# Altium footprint library pcb2D3D库101.PcbLib: 411 footprints (part 24 of 26)
Each footprint in its own frame and in the unit in brackets; x right, y up, seen from the top. Pads: shape width x height; smd on the part's side, far side on the other; paste and mask are expansions set on the pad; w line width, h text height; cw(c..) or ccw(c..) is an arc to the next point about the centre after c.
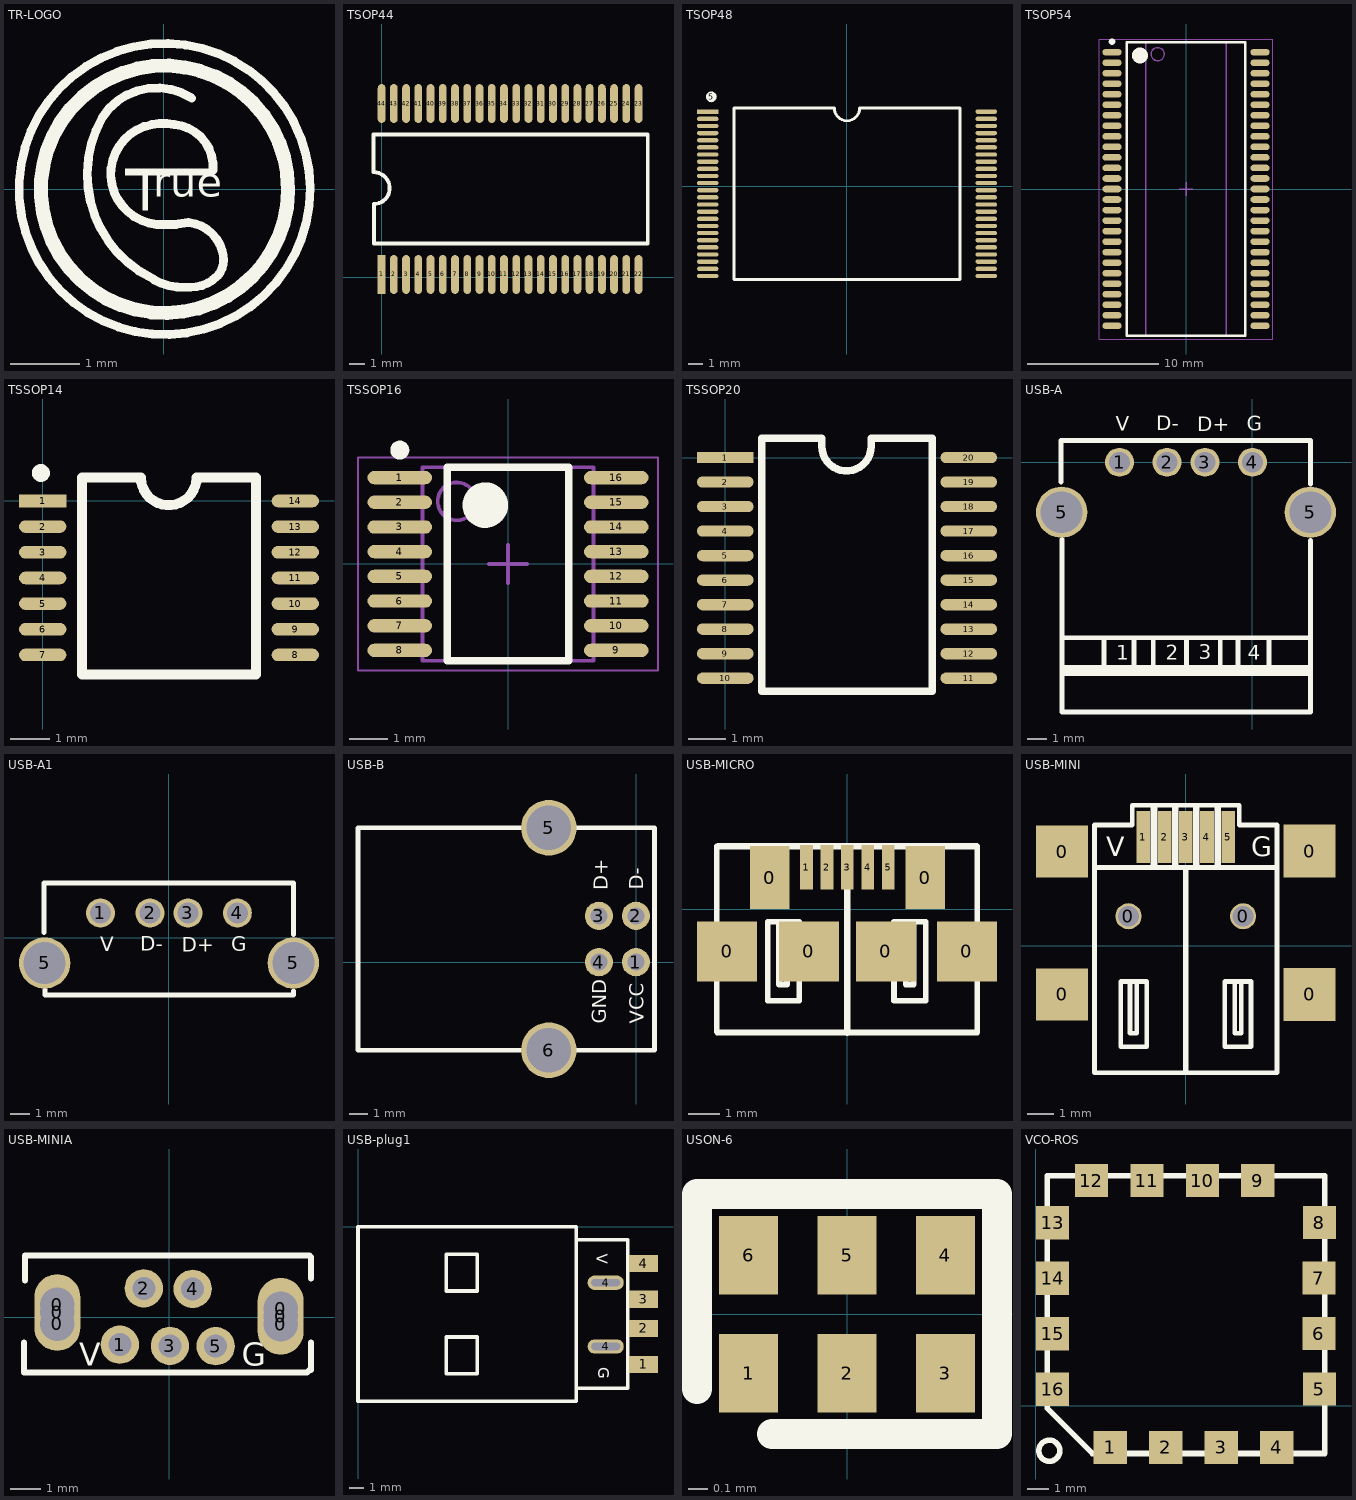
[diagram p23: the footprints below, top view; thin cyan lines are the x and y axes]

## TR-LOGO [mm]
TopOverlay:
  rectangle: -0.305,-0.305 -0.229,0.229
  rectangle: -0.559,0.203 0.737,0.305
  lines w0.127: -0.762,0.305 ccw(c-0.025,0.229) -0.102,-0.508 0.178,-0.508 ; -0.758,0.31 cw(c-0.046,0.234) -0.172,0.938 cw(c-0.006,0.112) 0.152,0.94 cw(c0.1,0.326) 0.714,0.279 ; -0.356,-1.182 cw(c0.572,0.216) -0.889,1.041 cw(c-0.102,0.533) 0.406,1.321 ; -0.356,-1.182 -0.132,-1.311 ccw(c0.267,-0.622) 0.306,-1.417 0.39,-1.417 ccw(c0.39,-0.873) 0.775,-1.257 ; 0.152,-0.508 0.356,-0.48 cw(c0.305,-1.041) 0.849,-0.893 cw(c0.49,-1.013) 0.777,-1.259 ; 2.107,-0.236 cw(c0.013,0.005) 2.108,-0.229
  lines w0.203: 1.803,-0.025 cw(c0.013,0.001) 1.803,0
  text "rue" at -0.152,-0.254 h0.75

## TSOP44 [mil]
pads (44):
  rect 20x100 smd: 1(0,7)
  oval 20x100 smd: 2(31.5,7) 3(63,7) 4(94.5,7) 5(126,7) 6(157.5,7) 7(189,7) 8(220.5,7) 9(252,7) 10(283.5,7) 11(315,7) 12(346.5,7) 13(378,7) 14(409.5,7) 15(441,7) 16(472.5,7) 17(504,7) 18(535.5,7) 19(567,7) 20(598.5,7) 21(630,7) 22(661.5,7) 23(661.5,447) 24(630,447) 25(598.5,447) 26(567,447) 27(535.5,447) 28(504,447) 29(472.5,447) 30(441,447) 31(409.5,447) 32(378,447) 33(346.5,447) 34(315,447) 35(283.5,447) 36(252,447) 37(220.5,447) 38(189,447) 39(157.5,447) 40(126,447) 41(94.5,447) 42(63,447) 43(31.5,447) 44(0,447)
TopOverlay:
  lines w10: -20.59,270 -20.59,367 685,367 685,87 -20,87 -20,183.41 ; -20,188.4 ccw(c-20,229.2) -20,270
3D body "TSOP44.STEP": height 48.24, standoff -3.69, extent -27.46,-5 689.47,457.99

## TSOP48 [mm]
pads (49):
  rect 1.5x0.3 smd: 1(-9.754,5.229)
  oval 1.5x0.3 smd: 2(-9.754,4.729) 3(-9.754,4.229) 4(-9.754,3.729) 5(-9.754,3.229) 6(-9.754,2.729) 7(-9.754,2.229) 8(-9.754,1.729) 9(-9.754,1.229) 10(-9.754,0.729) 11(-9.754,0.229) 12(-9.754,-0.271) 13(-9.754,-0.771) 14(-9.754,-1.271) 15(-9.754,-1.771) 16(-9.754,-2.271) 17(-9.754,-2.771) 18(-9.754,-3.271) 19(-9.754,-3.771) 20(-9.754,-4.271) 21(-9.754,-4.771) 22(-9.754,-5.271) 23(-9.754,-5.771) 24(-9.754,-6.271) 25(9.754,-6.271) 26(9.754,-5.771) 27(9.754,-5.271) 28(9.754,-4.771) 29(9.754,-4.271) 30(9.754,-3.771) 31(9.754,-3.271) 32(9.754,-2.771) 33(9.754,-2.271) 34(9.754,-1.771) 35(9.754,-1.271) 36(9.754,-0.771) 37(9.754,-0.271) 38(9.754,0.229) 39(9.754,0.729) 40(9.754,1.229) 41(9.754,1.729) 42(9.754,2.229) 43(9.754,2.729) 44(9.754,3.229) 45(9.754,3.729) 46(9.754,4.229) 47(9.754,4.729) 48(9.754,5.229)
  round 0.762 on Top Overlay: 5(-9.5,6.271)
TopOverlay:
  lines w0.2: -7.915,-6.521 7.915,-6.521 7.915,5.479 0.883,5.479 cw(c0,5.479) -0.883,5.479 -7.915,5.479 -7.915,-6.521
3D body "TSOP48.STEP": height 1.2, standoff -0.06, extent -10.05,-6.591 10.05,5.509

## TSOP54 [mm] "TSOP, 54-Leads, Body 22.20x6.00mm, Pitch 0.80mm, IPC Medium Density"
height 1.1
pads (54):
  oval 1.45x0.5 smd: 1(-5.625,10.4) 2(-5.625,9.6) 3(-5.625,8.8) 4(-5.625,8) 5(-5.625,7.2) 6(-5.625,6.4) 7(-5.625,5.6) 8(-5.625,4.8) 9(-5.625,4) 10(-5.625,3.2) 11(-5.625,2.4) 12(-5.625,1.6) 13(-5.625,0.8) 14(-5.625,0) 15(-5.625,-0.8) 16(-5.625,-1.6) 17(-5.625,-2.4) 18(-5.625,-3.2) 19(-5.625,-4) 20(-5.625,-4.8) 21(-5.625,-5.6) 22(-5.625,-6.4) 23(-5.625,-7.2) 24(-5.625,-8) 25(-5.625,-8.8) 26(-5.625,-9.6) 27(-5.625,-10.4) 28(5.625,-10.4) 29(5.625,-9.6) 30(5.625,-8.8) 31(5.625,-8) 32(5.625,-7.2) 33(5.625,-6.4) 34(5.625,-5.6) 35(5.625,-4.8) 36(5.625,-4) 37(5.625,-3.2) 38(5.625,-2.4) 39(5.625,-1.6) 40(5.625,-0.8) 41(5.625,0) 42(5.625,0.8) 43(5.625,1.6) 44(5.625,2.4) 45(5.625,3.2) 46(5.625,4) 47(5.625,4.8) 48(5.625,5.6) 49(5.625,6.4) 50(5.625,7.2) 51(5.625,8) 52(5.625,8.8) 53(5.625,9.6) 54(5.625,10.4)
TopOverlay:
  circle w0.25: c-5.625,11.2 r0.125
  circle w0.6: c-3.5,10.15 r0.3
  lines w0.2: -4.5,-11.15 -4.5,11.15 4.5,11.15 4.5,-11.15 -4.5,-11.15
Mechanical13:
  circle w0.1: c-2.15,10.25 r0.5
  lines w0.1: -3.05,-11.15 -3.05,11.15 3.05,11.15 3.05,-11.15 -3.05,-11.15
Mechanical15:
  lines w0.05: -6.6,-11.4 -6.6,11.4 6.6,11.4 6.6,-11.4 -6.6,-11.4
  lines w0.1: -0.5,0 0.5,0 ; 0,-0.5 0,0.5
3D body "tSOP-54.step": height 1.25, standoff 0, extent -5.855,-11.095 5.906,11.125

## TSSOP14 [mm]
pads (14):
  rect 1.2x0.32 smd: 1(0,0)
  oval 1.2x0.32 smd: 2(0,-0.65) 3(0,-1.3) 4(0,-1.95) 5(0,-2.6) 6(0,-3.25) 7(0,-3.9) 8(6.4,-3.9) 9(6.4,-3.25) 10(6.4,-2.6) 11(6.4,-1.95) 12(6.4,-1.3) 13(6.4,-0.65) 14(6.4,0)
TopOverlay:
  lines w0.254: 0,0.8 ccw(c-0.045,0.711) 0.026,0.781 ; 1,-4.4 5.4,-4.4 5.4,0.6 3.9,0.6 cw(c3.194,0.6) 2.487,0.6 1,0.6 1,-4.4
3D body "TSSOP14.STEP": height 1.2, standoff 0, extent 0.026,-4.506 6.426,0.594

## TSSOP16 [mm] "TSOP, 16-Leads, Body 5.00x4.40mm, Pitch 0.65mm, IPC Medium Density"
height 1.2
pads (16):
  oval 1.7x0.35 smd: 1(-2.85,2.275) 2(-2.85,1.625) 3(-2.85,0.975) 4(-2.85,0.325) 5(-2.85,-0.325) 6(-2.85,-0.975) 7(-2.85,-1.625) 8(-2.85,-2.275) 9(2.85,-2.275) 10(2.85,-1.625) 11(2.85,-0.975) 12(2.85,-0.325) 13(2.85,0.325) 14(2.85,0.975) 15(2.85,1.625) 16(2.85,2.275)
TopOverlay:
  circle w0.25: c-2.85,3 r0.125
  circle w0.6: c-0.6,1.55 r0.3
  lines w0.2: -1.6,-2.55 -1.6,2.55 1.6,2.55 1.6,-2.55 -1.6,-2.55
Mechanical13:
  circle w0.1: c-1.35,1.65 r0.5
  lines w0.1: -2.25,-2.55 -2.25,2.55 2.25,2.55 2.25,-2.55 -2.25,-2.55
Mechanical15:
  lines w0.05: -3.95,-2.8 -3.95,2.8 3.95,2.8 3.95,-2.8 -3.95,-2.8
  lines w0.1: -0.5,0 0.5,0 ; 0,-0.5 0,0.5
3D body "TSSOP16.step": height 1.09, standoff 0, extent -3.115,-2.515 3.165,2.485

## TSSOP20 [mm]
pads (20):
  rect 1.5x0.3 smd: 1(0,0)
  oval 1.5x0.3 smd: 2(0,-0.65) 3(0,-1.3) 4(0,-1.95) 5(0,-2.6) 6(0,-3.25) 7(0,-3.9) 8(0,-4.55) 9(0,-5.2) 10(0,-5.85) 11(6.454,-5.85) 12(6.454,-5.2) 13(6.454,-4.55) 14(6.454,-3.9) 15(6.454,-3.25) 16(6.454,-2.6) 17(6.454,-1.95) 18(6.454,-1.3) 19(6.454,-0.65) 20(6.454,0)
TopOverlay:
  lines w0.2: 0.965,-6.2 5.486,-6.2 5.486,0.508 3.87,0.508 3.87,0.3 cw(c3.214,0.3) 2.559,0.3 2.559,0.508 0.965,0.508 0.965,-6.2
3D body "TSSOP-20.STEP": height 1.2, standoff 0, extent -0.049,-6.221 6.501,0.379

## USB-A [mm]
pads (6):
  round 1.524 hole 1.1: 1(-7,0) 2(-4.5,0) 3(-2.5,0) 4(0,0)
  round 2.7 hole 2.2: 5(-10.05,-2.635) 5(3.05,-2.635)
TopOverlay:
  lines w0.254: -10.079,-1.041 -10.079,1.143 3.053,1.143 3.053,-1.143 3.053,0.356 ; -10.028,-9.246 3.053,-9.246 ; -10.028,-4.064 -10.028,-13.157 3.053,-13.157 3.053,-4.115 ; -10.002,-11.135 3.053,-11.135 ; -10.002,-10.922 3.053,-10.922 ; -9.875,-10.795 3.053,-10.795 ; -7.818,-10.795 -7.818,-9.246 ; -6.243,-10.795 -6.243,-9.322 ; -5.227,-10.82 -5.227,-9.271 ; -3.475,-10.795 -3.475,-9.322 ; -1.697,-10.897 -1.697,-9.271 ; -0.757,-10.871 -0.757,-9.271 ; 0.869,-10.998 0.869,-9.296
  text "V" at -7.188,1.651 h0.76
  text "G" at -0.305,1.651 h0.76
  text "1" at -7.163,-10.414 h0.76
  text "2" at -4.572,-10.414 h0.76
  text "3" at -2.819,-10.389 h0.76
  text "4" at -0.254,-10.414 h0.76
  text "D+" at -2.896,1.626 h0.76
  text "D-" at -5.08,1.676 h0.76
3D body "Samtec-USBR-A-S-S-O-TH.STEP": height 2.2, standoff -8.65, extent -11.202,-12.979 4.598,1.181

## USB-A1 [mm]
pads (6):
  round 1.524 hole 1.1: 1(-3.612,1.317) 2(-1,1.317) 3(1,1.317) 4(3.602,1.317)
  round 2.7 hole 2.2: 5(-6.55,-1.317) 5(6.55,-1.317)
TopOverlay:
  lines w0.254: -6.579,0.276 -6.579,2.892 6.553,2.892 6.553,0.174 6.553,1.673 ; -6.528,-2.747 -6.528,-3.001 6.553,-3.001 6.553,-2.797
  text "V" at -3.612,-0.689 h0.76
  text "G" at 3.271,-0.689 h0.76
  text "D+" at 0.681,-0.715 h0.76
  text "D-" at -1.504,-0.664 h0.76
3D body "USB-A立式.ste": height 15.5, standoff -3.4, extent -7.587,-3.371 7.475,3.629

## USB-B [mm]
pads (6):
  round 1.524 hole 0.92: 1(-0.02,0.009) 2(-0.02,2.509) 3(-2.02,2.509) 4(-2.02,0.009)
  round 3 hole 2.4: 5(-4.72,7.259) 6(-4.72,-4.741)
TopOverlay:
  lines w0.254: -15.02,-4.741 0.98,-4.741 0.98,7.259 -15.02,7.259 -15.02,-4.741
  text "GND" at -1.626,-3.302 h0.76
  text "VCC" at 0.406,-3.302 h0.76
  text "D+" at -1.549,3.886 h0.76
  text "D-" at 0.381,3.912 h0.76
3D body "USB-B.step": height 11.4, standoff -3.58, extent -15.059,-6.047 1.141,8.435

## USB-MICRO [mm]
pads (11):
  rect 1.9x1.9 smd: 0(-3.797,-1.333) 0(-1.206,-1.333) 0(1.232,-1.333) 0(3.797,-1.333)
  rect 1.25x2 smd: 0(-2.451,1.003) 0(2.476,1.003)
  rect 0.4x1.4 smd: 1(-1.283,1.333) 2(-0.635,1.333) 3(0.013,1.333) 4(0.66,1.333) 5(1.308,1.333)
TopOverlay:
  lines w0.178: -4.127,-3.873 -4.127,1.994 ; -4.102,-3.899 4.102,-3.899 ; -2.152,-0.394 -2.152,-2.379 -1.949,-2.379 -1.898,-2.379 -1.898,-0.394 ; 1.861,-0.394 1.861,-2.379 2.115,-2.379 2.115,-0.394 ; 4.127,-3.899 4.127,1.994 ; -2.513,-2.894 -1.513,-2.894 -1.513,-0.394 -2.513,-0.394 -2.513,-2.894 ; 1.487,-2.894 1.487,-0.394 2.487,-0.394 2.487,-2.894 1.487,-2.894
  lines w0.2: -4.077,1.994 4.102,1.994 ; 0.013,-3.91 0.013,1.968
3D body "MICRO USB.STEP": height 2.77, standoff -0.17, extent -4.1,-3.912 4.1,2.018

## USB-MINI [mm]
pads (11):
  rect 2x2 smd: 0(-4.746,-1.872) 0(-4.746,3.612)
  round 1 hole 0.8: 0(-2.2,1.128) 0(2.2,1.128)
  rect 2x2.032 smd: 0(4.746,-1.872) 0(4.746,3.628)
  rect 0.52x2 smd: 1(-1.626,4.166) 2(-0.813,4.166) 3(0,4.166) 4(0.813,4.166) 5(1.626,4.166)
TopOverlay:
  rectangle: -1.346,3.048 -1.092,5.309
  rectangle: -0.533,3.048 -0.279,5.309
  rectangle: 0.279,3.073 0.533,5.334
  rectangle: 1.092,3.073 1.346,5.334
  lines w0.178: -2.139,-1.372 -2.139,-3.357 -1.936,-3.357 -1.885,-3.357 -1.885,-1.372 ; 1.874,-1.372 1.874,-3.357 2.128,-3.357 2.128,-1.372 ; -3.5,-4.872 3.5,-4.872 3.5,4.628 2.057,4.628 2.057,5.385 0.942,5.385 -2.057,5.385 -2.057,4.628 -2.636,4.628 -3.5,4.628 -3.5,-4.872 ; -2.5,-3.872 -2.5,-1.372 -1.5,-1.372 -1.5,-3.872 -2.5,-3.872 ; 1.5,-3.872 2.5,-3.872 2.5,-1.372 1.5,-1.372 1.5,-3.872
  lines w0.2: -3.464,3.001 3.486,3.001 ; 0,-4.851 0,2.997
  text "G" at 2.515,3.429 h0.76
  text "V" at -3.048,3.429 h0.76
3D body "miniUSB-DIP.STEP": height 3.95, standoff -1, extent -5.315,-4.625 5.385,4.575

## USB-MINIA [mil]
pads (11):
  round 50 hole 45: 0(-145.62,-8.59) 0(-145.62,16.34) 0(145.62,-9.22) 0(145.62,11.09)
  oval 60x100 hole 45: 0(-145.62,6.28) 0(145.62,1.28)
  round 50 hole 30: 1(-64.06,-35.78) 2(-32.81,37.66) 3(1.25,-37.34) 4(30.94,37.03) 5(60.94,-37.66)
TopOverlay:
  lines w7.87: -188.94,-32.72 -188.94,-71.72 180.06,-71.72 183.06,-68.72 185.06,-68.72 185.06,-32.72 ; -187.94,48.28 -187.94,80.28 183.06,80.28 185.06,78.28 185.06,50.28
  text "V" at -117,-63 h30
  text "G" at 95,-63 h30
3D body "usb_a-usb_b-m5-top.stp": height 393.7, standoff -84.65, extent -200.73,-74.3 200.85,79.28

## USB-plug1 [mm]
pads (6):
  rect 2x1.2 smd: 1(19.761,-9.525) 2(19.761,-7.036) 3(19.761,-5.004) 4(19.761,-2.54)
  oval 2.5x1 hole 0.5 slot 2 at 0 deg: 4(17.145,-8.28) 4(17.145,-3.861)
TopOverlay:
  lines w0.254: 0,-12.065 15.113,-12.065 15.113,-4.191 15.113,0 0,0 0,-12.065 ; 6.096,-10.16 8.255,-10.16 8.255,-7.62 6.096,-7.62 6.096,-10.16 ; 6.096,-4.445 6.096,-1.905 8.255,-1.905 8.255,-4.445 6.096,-4.445 ; 15.113,-11.176 18.669,-11.176 18.669,-0.889 15.113,-0.889 15.113,-10.033 15.113,-11.176
  text "V" at 16.535,-1.854 h0.76
  text "G" at 16.612,-9.728 h0.76
KeepOutLayer:
  lines w0.051: 16.154,-4.089 18.085,-4.089 18.085,-3.581 17.932,-3.581 16.383,-3.581 16.154,-3.581 16.154,-4.089 ; 16.205,-8.509 16.205,-8.001 16.434,-8.001 17.983,-8.001 18.136,-8.001 18.136,-8.509 16.205,-8.509
3D body "User Library-usbap-1p.step": height 2.22, standoff -2.27, extent 0.211,-12.076 20.211,-0.076

## USON-6 [mm]
pads (6):
  rect 0.3x0.4 smd: 1(-0.5,-0.3) 2(0,-0.3) 3(0.5,-0.3) 4(0.5,0.3) 5(0,0.3) 6(-0.5,0.3)
TopOverlay:
  lines w0.152: -0.762,-0.381 -0.762,0.612 ; -0.762,0.61 0.762,0.61 0.762,-0.61 -0.381,-0.61
3D body "USON-6.STEP": height 0.6, standoff 0, extent -0.745,-0.537 0.755,0.533

## VCO-ROS [mm] "ROS-425-319"
height 5.33
pads (16):
  rect 1.52x1.52 smd: 1(3.404,-1.905) 2(5.944,-1.905) 3(8.484,-1.905) 4(11.024,-1.905) 5(12.979,0.768) 6(12.954,3.308) 7(12.954,5.848) 8(12.979,8.388) 9(10.16,10.312) 10(7.62,10.312) 11(5.08,10.312) 12(2.54,10.312) 13(0.762,8.382) 14(0.762,5.842) 15(0.762,3.302) 16(0.762,0.762)
TopOverlay:
  circle w0.254: c0.61,-2.057 r0.483
  lines w0.254: 0.508,-0.108 0.508,10.541 13.233,10.541 13.233,-2.184 2.584,-2.184 0.508,-0.108
3D body "ROS-425-319 in CK605 case detailed.step": height 4.57, standoff 0, extent 0.508,-2.184 13.208,10.516